# Altium schematic symbol library jlcpcb_2025_04_capacitors_extended_0402.schlib: 3594 symbols (part 5 of 20) (continued)
## C0402X7R104K250NTB
designator C?  Capacitance: 100nF  (hidden comment: *)
Capacitor, Ceramic (MLCC), 100nF, ±10%, 25V, X7R, ±10%, SMD 0402; Manufacturer: EYANG(Shenzhen Eyang Tech Development); Manufacturer Part Number: C0402X7R104K250NTB; Package Size: 0402; JLCPCB Basic Part: No; JLCPCB Part Number: C778290; Supplier 1: LCSC; Category: Capacitors - MLCC; Supplier Part Number 1: C778290; Tolerance: ±10%; Voltage Rating: 25V; Temperature Coefficient: X7R; RoHS: Yes; ComponentLink1Description: Datasheet; ComponentLink1URL: https://datasheet.lcsc.com/lcsc/2009101507_EYANG-Shenzhen-Eyang-Tech-Development-C0402X7R104K250NTB_C778290.pdf; ComponentLink2Description: JLCPCB Part URL; ComponentLink2URL: https://jlcpcb.com/partdetail/C778290; ComponentLink3Description: LCSC Part URL; ComponentLink3URL: https://lcsc.com/product-detail/Multilayer-Ceramic-Capacitors-MLCC---SMD-SMT_EYANGShenzhen-Eyang-Tech-Development-EYANGShenzhen-Eyang-Tech-Development-C0402X7R104K250NTB_C778290.html
footprint CAP-0402 (0402 (1005M) Capacitor)
pins: 1, 2

## C0402X7R104K250NTN
designator C?  Capacitance: 100nF  (hidden comment: *)
Capacitor, Ceramic (MLCC), 100nF, ±10%, 25V, X7R, ±10%, SMD 0402; Manufacturer: EYANG(Shenzhen Eyang Tech Development); Manufacturer Part Number: C0402X7R104K250NTN; Package Size: 0402; JLCPCB Basic Part: No; JLCPCB Part Number: C314229; Supplier 1: LCSC; Category: Capacitors - MLCC; Supplier Part Number 1: C314229; Tolerance: ±10%; Voltage Rating: 25V; Temperature Coefficient: X7R; RoHS: Yes; ComponentLink1Description: Datasheet; ComponentLink1URL: https://datasheet.lcsc.com/lcsc/2304140030_EYANG-Shenzhen-Eyang-Tech-Development-C0402X7R104K250NTN_C314229.pdf; ComponentLink2Description: JLCPCB Part URL; ComponentLink2URL: https://jlcpcb.com/partdetail/C314229; ComponentLink3Description: LCSC Part URL; ComponentLink3URL: https://lcsc.com/product-detail/Multilayer-Ceramic-Capacitors-MLCC---SMD-SMT_EYANGShenzhen-Eyang-Tech-Development-EYANGShenzhen-Eyang-Tech-Development-C0402X7R104K250NTN_C314229.html
footprint CAP-0402 (0402 (1005M) Capacitor)
pins: 1, 2

## C0402X7R122K160NTB
designator C?  Capacitance: 1.2nF  (hidden comment: *)
Capacitor, Ceramic (MLCC), 1.2nF, ±10%, 16V, X7R, ±10%, SMD 0402; Manufacturer: EYANG(Shenzhen Eyang Tech Development); Manufacturer Part Number: C0402X7R122K160NTB; Package Size: 0402; JLCPCB Basic Part: No; JLCPCB Part Number: C778309; Supplier 1: LCSC; Category: Capacitors - MLCC; Supplier Part Number 1: C778309; Tolerance: ±10%; Voltage Rating: 16V; Temperature Coefficient: X7R; RoHS: Yes; ComponentLink1Description: Datasheet; ComponentLink1URL: https://datasheet.lcsc.com/lcsc/2009051609_EYANG-Shenzhen-Eyang-Tech-Development-C0402X7R122K160NTB_C778309.pdf; ComponentLink2Description: JLCPCB Part URL; ComponentLink2URL: https://jlcpcb.com/partdetail/C778309; ComponentLink3Description: LCSC Part URL; ComponentLink3URL: https://lcsc.com/product-detail/Multilayer-Ceramic-Capacitors-MLCC---SMD-SMT_EYANGShenzhen-Eyang-Tech-Development-EYANGShenzhen-Eyang-Tech-Development-C0402X7R122K160NTB_C778309.html
footprint CAP-0402 (0402 (1005M) Capacitor)
pins: 1, 2

## C0402X7R122K500NTB
designator C?  Capacitance: 1.2nF  (hidden comment: *)
Capacitor, Ceramic (MLCC), 1.2nF, ±10%, 50V, X7R, ±10%, SMD 0402; Manufacturer: EYANG(Shenzhen Eyang Tech Development); Manufacturer Part Number: C0402X7R122K500NTB; Package Size: 0402; JLCPCB Basic Part: No; JLCPCB Part Number: C778390; Supplier 1: LCSC; Category: Capacitors - MLCC; Supplier Part Number 1: C778390; Tolerance: ±10%; Voltage Rating: 50V; Temperature Coefficient: X7R; RoHS: Yes; ComponentLink1Description: Datasheet; ComponentLink1URL: https://datasheet.lcsc.com/lcsc/2009051610_EYANG-Shenzhen-Eyang-Tech-Development-C0402X7R122K500NTB_C778390.pdf; ComponentLink2Description: JLCPCB Part URL; ComponentLink2URL: https://jlcpcb.com/partdetail/C778390; ComponentLink3Description: LCSC Part URL; ComponentLink3URL: https://lcsc.com/product-detail/Multilayer-Ceramic-Capacitors-MLCC---SMD-SMT_EYANGShenzhen-Eyang-Tech-Development-EYANGShenzhen-Eyang-Tech-Development-C0402X7R122K500NTB_C778390.html
footprint CAP-0402 (0402 (1005M) Capacitor)
pins: 1, 2

## C0402X7R151K500NTB
designator C?  Capacitance: 150pF  (hidden comment: *)
Capacitor, Ceramic (MLCC), 150pF, ±10%, 50V, X7R, ±10%, SMD 0402; Manufacturer: EYANG(Shenzhen Eyang Tech Development); Manufacturer Part Number: C0402X7R151K500NTB; Package Size: 0402; JLCPCB Basic Part: No; JLCPCB Part Number: C115673; Supplier 1: LCSC; Category: Capacitors - MLCC; Supplier Part Number 1: C115673; Tolerance: ±10%; Voltage Rating: 50V; Temperature Coefficient: X7R; RoHS: Yes; ComponentLink1Description: Datasheet; ComponentLink1URL: https://datasheet.lcsc.com/lcsc/2304140030_EYANG-Shenzhen-Eyang-Tech-Development-C0402X7R151K500NTB_C115673.pdf; ComponentLink2Description: JLCPCB Part URL; ComponentLink2URL: https://jlcpcb.com/partdetail/C115673; ComponentLink3Description: LCSC Part URL; ComponentLink3URL: https://lcsc.com/product-detail/Multilayer-Ceramic-Capacitors-MLCC---SMD-SMT_EYANGShenzhen-Eyang-Tech-Development-EYANGShenzhen-Eyang-Tech-Development-C0402X7R151K500NTB_C115673.html
footprint CAP-0402 (0402 (1005M) Capacitor)
pins: 1, 2

## C0402X7R153M160NTB
designator C?  Capacitance: 15nF  (hidden comment: *)
Capacitor, Ceramic (MLCC), 15nF, ±20%, 16V, X7R, ±20%, SMD 0402; Manufacturer: EYANG(Shenzhen Eyang Tech Development); Manufacturer Part Number: C0402X7R153M160NTB; Package Size: 0402; JLCPCB Basic Part: No; JLCPCB Part Number: C234199; Supplier 1: LCSC; Category: Capacitors - MLCC; Supplier Part Number 1: C234199; Tolerance: ±20%; Voltage Rating: 16V; Temperature Coefficient: X7R; RoHS: Yes; ComponentLink1Description: Datasheet; ComponentLink1URL: https://datasheet.lcsc.com/lcsc/1811021623_EYANG-Shenzhen-Eyang-Tech-Development-C0402X7R153M160NTB_C234199.pdf; ComponentLink2Description: JLCPCB Part URL; ComponentLink2URL: https://jlcpcb.com/partdetail/C234199; ComponentLink3Description: LCSC Part URL; ComponentLink3URL: https://lcsc.com/product-detail/Multilayer-Ceramic-Capacitors-MLCC---SMD-SMT_EYANGShenzhen-Eyang-Tech-Development-EYANGShenzhen-Eyang-Tech-Development-C0402X7R153M160NTB_C234199.html
footprint CAP-0402 (0402 (1005M) Capacitor)
pins: 1, 2

## C0402X7R182K500NTB
designator C?  Capacitance: 1.8nF  (hidden comment: *)
Capacitor, Ceramic (MLCC), 1.8nF, ±10%, 50V, X7R, ±10%, SMD 0402; Manufacturer: EYANG(Shenzhen Eyang Tech Development); Manufacturer Part Number: C0402X7R182K500NTB; Package Size: 0402; JLCPCB Basic Part: No; JLCPCB Part Number: C115676; Supplier 1: LCSC; Category: Capacitors - MLCC; Supplier Part Number 1: C115676; Tolerance: ±10%; Voltage Rating: 50V; Temperature Coefficient: X7R; RoHS: Yes; ComponentLink1Description: Datasheet; ComponentLink1URL: https://datasheet.lcsc.com/lcsc/2304140030_EYANG-Shenzhen-Eyang-Tech-Development-C0402X7R182K500NTB_C115676.pdf; ComponentLink2Description: JLCPCB Part URL; ComponentLink2URL: https://jlcpcb.com/partdetail/C115676; ComponentLink3Description: LCSC Part URL; ComponentLink3URL: https://lcsc.com/product-detail/Multilayer-Ceramic-Capacitors-MLCC---SMD-SMT_EYANGShenzhen-Eyang-Tech-Development-EYANGShenzhen-Eyang-Tech-Development-C0402X7R182K500NTB_C115676.html
footprint CAP-0402 (0402 (1005M) Capacitor)
pins: 1, 2

## C0402X7R182M500NTB
designator C?  Capacitance: 1.8nF  (hidden comment: *)
Capacitor, Ceramic (MLCC), 1.8nF, ±20%, 50V, X7R, ±20%, SMD 0402; Manufacturer: EYANG(Shenzhen Eyang Tech Development); Manufacturer Part Number: C0402X7R182M500NTB; Package Size: 0402; JLCPCB Basic Part: No; JLCPCB Part Number: C183744; Supplier 1: LCSC; Category: Capacitors - MLCC; Supplier Part Number 1: C183744; Tolerance: ±20%; Voltage Rating: 50V; Temperature Coefficient: X7R; RoHS: Yes; ComponentLink1Description: Datasheet; ComponentLink1URL: https://datasheet.lcsc.com/lcsc/2304140030_EYANG-Shenzhen-Eyang-Tech-Development-C0402X7R182M500NTB_C183744.pdf; ComponentLink2Description: JLCPCB Part URL; ComponentLink2URL: https://jlcpcb.com/partdetail/C183744; ComponentLink3Description: LCSC Part URL; ComponentLink3URL: https://lcsc.com/product-detail/Multilayer-Ceramic-Capacitors-MLCC---SMD-SMT_EYANGShenzhen-Eyang-Tech-Development-EYANGShenzhen-Eyang-Tech-Development-C0402X7R182M500NTB_C183744.html
footprint CAP-0402 (0402 (1005M) Capacitor)
pins: 1, 2

## C0402X7R221K500NTB
designator C?  Capacitance: 220pF  (hidden comment: *)
Capacitor, Ceramic (MLCC), 220pF, ±10%, 50V, X7R, ±10%, SMD 0402; Manufacturer: EYANG(Shenzhen Eyang Tech Development); Manufacturer Part Number: C0402X7R221K500NTB; Package Size: 0402; JLCPCB Basic Part: No; JLCPCB Part Number: C115677; Supplier 1: LCSC; Category: Capacitors - MLCC; Supplier Part Number 1: C115677; Tolerance: ±10%; Voltage Rating: 50V; Temperature Coefficient: X7R; RoHS: Yes; ComponentLink1Description: Datasheet; ComponentLink1URL: https://datasheet.lcsc.com/lcsc/2304140030_EYANG-Shenzhen-Eyang-Tech-Development-C0402X7R221K500NTB_C115677.pdf; ComponentLink2Description: JLCPCB Part URL; ComponentLink2URL: https://jlcpcb.com/partdetail/C115677; ComponentLink3Description: LCSC Part URL; ComponentLink3URL: https://lcsc.com/product-detail/Multilayer-Ceramic-Capacitors-MLCC---SMD-SMT_EYANGShenzhen-Eyang-Tech-Development-EYANGShenzhen-Eyang-Tech-Development-C0402X7R221K500NTB_C115677.html
footprint CAP-0402 (0402 (1005M) Capacitor)
pins: 1, 2

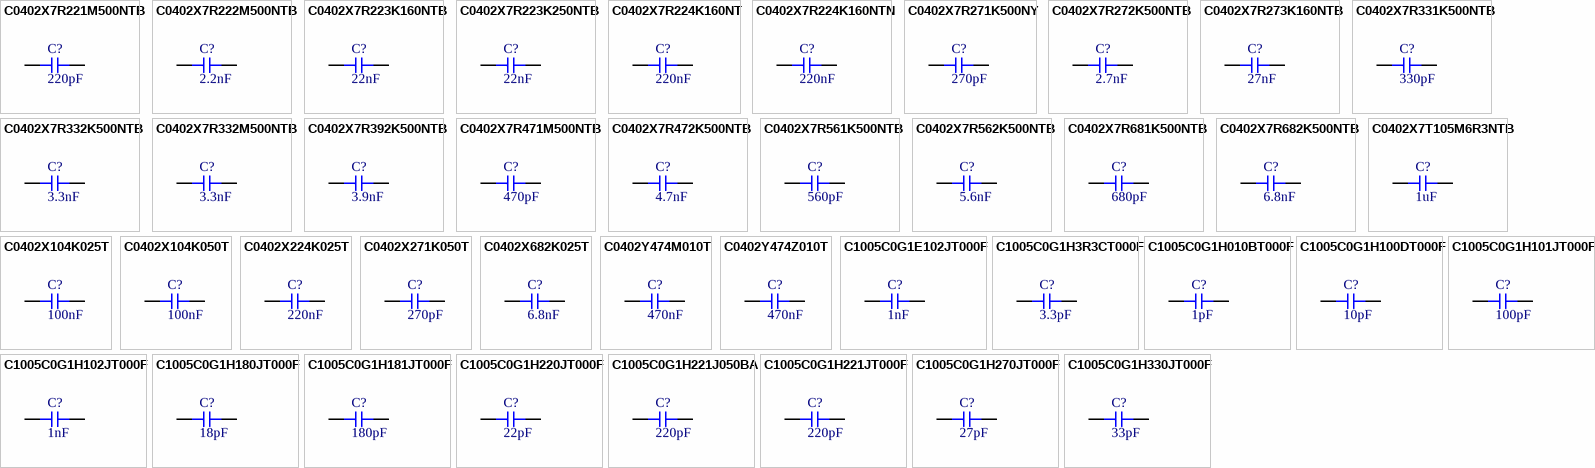
[diagram p22: symbols C0402X7R221M500NTB to C1005C0G1H330JT000F]

## C0402X7R221M500NTB
designator C?  Capacitance: 220pF  (hidden comment: *)
Capacitor, Ceramic (MLCC), 220pF, ±20%, 50V, X7R, ±20%, SMD 0402; Manufacturer: EYANG(Shenzhen Eyang Tech Development); Manufacturer Part Number: C0402X7R221M500NTB; Package Size: 0402; JLCPCB Basic Part: No; JLCPCB Part Number: C183730; Supplier 1: LCSC; Category: Capacitors - MLCC; Supplier Part Number 1: C183730; Tolerance: ±20%; Voltage Rating: 50V; Temperature Coefficient: X7R; RoHS: Yes; ComponentLink1Description: Datasheet; ComponentLink1URL: https://datasheet.lcsc.com/lcsc/2304140030_EYANG-Shenzhen-Eyang-Tech-Development-C0402X7R221M500NTB_C183730.pdf; ComponentLink2Description: JLCPCB Part URL; ComponentLink2URL: https://jlcpcb.com/partdetail/C183730; ComponentLink3Description: LCSC Part URL; ComponentLink3URL: https://lcsc.com/product-detail/Multilayer-Ceramic-Capacitors-MLCC---SMD-SMT_EYANGShenzhen-Eyang-Tech-Development-EYANGShenzhen-Eyang-Tech-Development-C0402X7R221M500NTB_C183730.html
footprint CAP-0402 (0402 (1005M) Capacitor)
pins: 1, 2

## C0402X7R222M500NTB
designator C?  Capacitance: 2.2nF  (hidden comment: *)
Capacitor, Ceramic (MLCC), 2.2nF, ±20%, 50V, X7R, ±20%, SMD 0402; Manufacturer: EYANG(Shenzhen Eyang Tech Development); Manufacturer Part Number: C0402X7R222M500NTB; Package Size: 0402; JLCPCB Basic Part: No; JLCPCB Part Number: C183745; Supplier 1: LCSC; Category: Capacitors - MLCC; Supplier Part Number 1: C183745; Tolerance: ±20%; Voltage Rating: 50V; Temperature Coefficient: X7R; RoHS: Yes; ComponentLink1Description: Datasheet; ComponentLink1URL: https://datasheet.lcsc.com/lcsc/2304140030_EYANG-Shenzhen-Eyang-Tech-Development-C0402X7R222M500NTB_C183745.pdf; ComponentLink2Description: JLCPCB Part URL; ComponentLink2URL: https://jlcpcb.com/partdetail/C183745; ComponentLink3Description: LCSC Part URL; ComponentLink3URL: https://lcsc.com/product-detail/Multilayer-Ceramic-Capacitors-MLCC---SMD-SMT_EYANGShenzhen-Eyang-Tech-Development-EYANGShenzhen-Eyang-Tech-Development-C0402X7R222M500NTB_C183745.html
footprint CAP-0402 (0402 (1005M) Capacitor)
pins: 1, 2

## C0402X7R223K160NTB
designator C?  Capacitance: 22nF  (hidden comment: *)
Capacitor, Ceramic (MLCC), 22nF, ±10%, 16V, X7R, ±10%, SMD 0402; Manufacturer: EYANG(Shenzhen Eyang Tech Development); Manufacturer Part Number: C0402X7R223K160NTB; Package Size: 0402; JLCPCB Basic Part: No; JLCPCB Part Number: C234031; Supplier 1: LCSC; Category: Capacitors - MLCC; Supplier Part Number 1: C234031; Tolerance: ±10%; Voltage Rating: 16V; Temperature Coefficient: X7R; RoHS: Yes; ComponentLink1Description: Datasheet; ComponentLink1URL: https://datasheet.lcsc.com/lcsc/1811021623_EYANG-Shenzhen-Eyang-Tech-Development-C0402X7R223K160NTB_C234031.pdf; ComponentLink2Description: JLCPCB Part URL; ComponentLink2URL: https://jlcpcb.com/partdetail/C234031; ComponentLink3Description: LCSC Part URL; ComponentLink3URL: https://lcsc.com/product-detail/Multilayer-Ceramic-Capacitors-MLCC---SMD-SMT_EYANGShenzhen-Eyang-Tech-Development-EYANGShenzhen-Eyang-Tech-Development-C0402X7R223K160NTB_C234031.html
footprint CAP-0402 (0402 (1005M) Capacitor)
pins: 1, 2

## C0402X7R223K250NTB
designator C?  Capacitance: 22nF  (hidden comment: *)
Capacitor, Ceramic (MLCC), 22nF, ±10%, 25V, X7R, ±10%, SMD 0402; Manufacturer: EYANG(Shenzhen Eyang Tech Development); Manufacturer Part Number: C0402X7R223K250NTB; Package Size: 0402; JLCPCB Basic Part: No; JLCPCB Part Number: C183767; Supplier 1: LCSC; Category: Capacitors - MLCC; Supplier Part Number 1: C183767; Tolerance: ±10%; Voltage Rating: 25V; Temperature Coefficient: X7R; RoHS: Yes; ComponentLink1Description: Datasheet; ComponentLink1URL: https://datasheet.lcsc.com/lcsc/2304140030_EYANG-Shenzhen-Eyang-Tech-Development-C0402X7R223K250NTB_C183767.pdf; ComponentLink2Description: JLCPCB Part URL; ComponentLink2URL: https://jlcpcb.com/partdetail/C183767; ComponentLink3Description: LCSC Part URL; ComponentLink3URL: https://lcsc.com/product-detail/Multilayer-Ceramic-Capacitors-MLCC---SMD-SMT_EYANGShenzhen-Eyang-Tech-Development-EYANGShenzhen-Eyang-Tech-Development-C0402X7R223K250NTB_C183767.html
footprint CAP-0402 (0402 (1005M) Capacitor)
pins: 1, 2

## C0402X7R224K160NT
designator C?  Capacitance: 220nF  (hidden comment: *)
Capacitor, Ceramic (MLCC), 220nF, ±10%, 16V, X7R, ±10%, SMD 0402; Manufacturer: SANYEAR; Manufacturer Part Number: C0402X7R224K160NT; Package Size: 0402; JLCPCB Basic Part: No; JLCPCB Part Number: C475248; Supplier 1: LCSC; Category: Capacitors - MLCC; Supplier Part Number 1: C475248; Tolerance: ±10%; Voltage Rating: 16V; Temperature Coefficient: X7R; RoHS: Yes; ComponentLink1Description: Datasheet; ComponentLink1URL: https://wmsc.lcsc.com/wmsc/upload/file/pdf/v2/lcsc/2304140030_SANYEAR-C0402X7R224K160NT_C475248.pdf; ComponentLink2Description: JLCPCB Part URL; ComponentLink2URL: https://jlcpcb.com/partdetail/C475248; ComponentLink3Description: LCSC Part URL; ComponentLink3URL: https://lcsc.com/product-detail/Multilayer-Ceramic-Capacitors-MLCC---SMD-SMT_SANYEAR-SANYEAR-C0402X7R224K160NT_C475248.html
footprint CAP-0402 (0402 (1005M) Capacitor)
pins: 1, 2

## C0402X7R224K160NTN
designator C?  Capacitance: 220nF  (hidden comment: *)
Capacitor, Ceramic (MLCC), 220nF, ±10%, 16V, X7R, ±10%, SMD 0402; Manufacturer: EYANG(Shenzhen Eyang Tech Development); Manufacturer Part Number: C0402X7R224K160NTN; Package Size: 0402; JLCPCB Basic Part: No; JLCPCB Part Number: C314232; Supplier 1: LCSC; Category: Capacitors - MLCC; Supplier Part Number 1: C314232; Tolerance: ±10%; Voltage Rating: 16V; Temperature Coefficient: X7R; RoHS: Yes; ComponentLink1Description: Datasheet; ComponentLink1URL: https://datasheet.lcsc.com/lcsc/2304140030_EYANG-Shenzhen-Eyang-Tech-Development-C0402X7R224K160NTN_C314232.pdf; ComponentLink2Description: JLCPCB Part URL; ComponentLink2URL: https://jlcpcb.com/partdetail/C314232; ComponentLink3Description: LCSC Part URL; ComponentLink3URL: https://lcsc.com/product-detail/Multilayer-Ceramic-Capacitors-MLCC---SMD-SMT_EYANGShenzhen-Eyang-Tech-Development-EYANGShenzhen-Eyang-Tech-Development-C0402X7R224K160NTN_C314232.html
footprint CAP-0402 (0402 (1005M) Capacitor)
pins: 1, 2

## C0402X7R271K500NY
designator C?  Capacitance: 270pF  (hidden comment: *)
Capacitor, Ceramic (MLCC), 270pF, ±10%, 50V, X7R, ±10%, SMD 0402; Manufacturer: EYANG(Shenzhen Eyang Tech Development); Manufacturer Part Number: C0402X7R271K500NY; Package Size: 0402; JLCPCB Basic Part: No; JLCPCB Part Number: C314226; Supplier 1: LCSC; Category: Capacitors - MLCC; Supplier Part Number 1: C314226; Tolerance: ±10%; Voltage Rating: 50V; Temperature Coefficient: X7R; RoHS: Yes; ComponentLink1Description: Datasheet; ComponentLink1URL: https://datasheet.lcsc.com/lcsc/2304140030_EYANG-Shenzhen-Eyang-Tech-Development-C0402X7R271K500NY_C314226.pdf; ComponentLink2Description: JLCPCB Part URL; ComponentLink2URL: https://jlcpcb.com/partdetail/C314226; ComponentLink3Description: LCSC Part URL; ComponentLink3URL: https://lcsc.com/product-detail/Multilayer-Ceramic-Capacitors-MLCC---SMD-SMT_EYANGShenzhen-Eyang-Tech-Development-EYANGShenzhen-Eyang-Tech-Development-C0402X7R271K500NY_C314226.html
footprint CAP-0402 (0402 (1005M) Capacitor)
pins: 1, 2

## C0402X7R272K500NTB
designator C?  Capacitance: 2.7nF  (hidden comment: *)
Capacitor, Ceramic (MLCC), 2.7nF, ±10%, 50V, X7R, ±10%, SMD 0402; Manufacturer: EYANG(Shenzhen Eyang Tech Development); Manufacturer Part Number: C0402X7R272K500NTB; Package Size: 0402; JLCPCB Basic Part: No; JLCPCB Part Number: C115680; Supplier 1: LCSC; Category: Capacitors - MLCC; Supplier Part Number 1: C115680; Tolerance: ±10%; Voltage Rating: 50V; Temperature Coefficient: X7R; RoHS: Yes; ComponentLink1Description: Datasheet; ComponentLink1URL: https://datasheet.lcsc.com/lcsc/2304140030_EYANG-Shenzhen-Eyang-Tech-Development-C0402X7R272K500NTB_C115680.pdf; ComponentLink2Description: JLCPCB Part URL; ComponentLink2URL: https://jlcpcb.com/partdetail/C115680; ComponentLink3Description: LCSC Part URL; ComponentLink3URL: https://lcsc.com/product-detail/Multilayer-Ceramic-Capacitors-MLCC---SMD-SMT_EYANGShenzhen-Eyang-Tech-Development-EYANGShenzhen-Eyang-Tech-Development-C0402X7R272K500NTB_C115680.html
footprint CAP-0402 (0402 (1005M) Capacitor)
pins: 1, 2

## C0402X7R273K160NTB
designator C?  Capacitance: 27nF  (hidden comment: *)
Capacitor, Ceramic (MLCC), 27nF, ±10%, 16V, X7R, ±10%, SMD 0402; Manufacturer: EYANG(Shenzhen Eyang Tech Development); Manufacturer Part Number: C0402X7R273K160NTB; Package Size: 0402; JLCPCB Basic Part: No; JLCPCB Part Number: C778389; Supplier 1: LCSC; Category: Capacitors - MLCC; Supplier Part Number 1: C778389; Tolerance: ±10%; Voltage Rating: 16V; Temperature Coefficient: X7R; RoHS: Yes; ComponentLink1Description: Datasheet; ComponentLink1URL: https://datasheet.lcsc.com/lcsc/2009051610_EYANG-Shenzhen-Eyang-Tech-Development-C0402X7R273K160NTB_C778389.pdf; ComponentLink2Description: JLCPCB Part URL; ComponentLink2URL: https://jlcpcb.com/partdetail/C778389; ComponentLink3Description: LCSC Part URL; ComponentLink3URL: https://lcsc.com/product-detail/Multilayer-Ceramic-Capacitors-MLCC---SMD-SMT_EYANGShenzhen-Eyang-Tech-Development-EYANGShenzhen-Eyang-Tech-Development-C0402X7R273K160NTB_C778389.html
footprint CAP-0402 (0402 (1005M) Capacitor)
pins: 1, 2

## C0402X7R331K500NTB
designator C?  Capacitance: 330pF  (hidden comment: *)
Capacitor, Ceramic (MLCC), 330pF, ±10%, 50V, X7R, ±10%, SMD 0402; Manufacturer: EYANG(Shenzhen Eyang Tech Development); Manufacturer Part Number: C0402X7R331K500NTB; Package Size: 0402; JLCPCB Basic Part: No; JLCPCB Part Number: C115681; Supplier 1: LCSC; Category: Capacitors - MLCC; Supplier Part Number 1: C115681; Tolerance: ±10%; Voltage Rating: 50V; Temperature Coefficient: X7R; RoHS: Yes; ComponentLink1Description: Datasheet; ComponentLink1URL: https://datasheet.lcsc.com/lcsc/2304140030_EYANG-Shenzhen-Eyang-Tech-Development-C0402X7R331K500NTB_C115681.pdf; ComponentLink2Description: JLCPCB Part URL; ComponentLink2URL: https://jlcpcb.com/partdetail/C115681; ComponentLink3Description: LCSC Part URL; ComponentLink3URL: https://lcsc.com/product-detail/Multilayer-Ceramic-Capacitors-MLCC---SMD-SMT_EYANGShenzhen-Eyang-Tech-Development-EYANGShenzhen-Eyang-Tech-Development-C0402X7R331K500NTB_C115681.html
footprint CAP-0402 (0402 (1005M) Capacitor)
pins: 1, 2

## C0402X7R332K500NTB
designator C?  Capacitance: 3.3nF  (hidden comment: *)
Capacitor, Ceramic (MLCC), 3.3nF, ±10%, 50V, X7R, ±10%, SMD 0402; Manufacturer: EYANG(Shenzhen Eyang Tech Development); Manufacturer Part Number: C0402X7R332K500NTB; Package Size: 0402; JLCPCB Basic Part: No; JLCPCB Part Number: C115682; Supplier 1: LCSC; Category: Capacitors - MLCC; Supplier Part Number 1: C115682; Tolerance: ±10%; Voltage Rating: 50V; Temperature Coefficient: X7R; RoHS: Yes; ComponentLink1Description: Datasheet; ComponentLink1URL: https://datasheet.lcsc.com/lcsc/2304140030_EYANG-Shenzhen-Eyang-Tech-Development-C0402X7R332K500NTB_C115682.pdf; ComponentLink2Description: JLCPCB Part URL; ComponentLink2URL: https://jlcpcb.com/partdetail/C115682; ComponentLink3Description: LCSC Part URL; ComponentLink3URL: https://lcsc.com/product-detail/Multilayer-Ceramic-Capacitors-MLCC---SMD-SMT_EYANGShenzhen-Eyang-Tech-Development-EYANGShenzhen-Eyang-Tech-Development-C0402X7R332K500NTB_C115682.html
footprint CAP-0402 (0402 (1005M) Capacitor)
pins: 1, 2

## C0402X7R332M500NTB
designator C?  Capacitance: 3.3nF  (hidden comment: *)
Capacitor, Ceramic (MLCC), 3.3nF, ±20%, 50V, X7R, ±20%, SMD 0402; Manufacturer: EYANG(Shenzhen Eyang Tech Development); Manufacturer Part Number: C0402X7R332M500NTB; Package Size: 0402; JLCPCB Basic Part: No; JLCPCB Part Number: C183746; Supplier 1: LCSC; Category: Capacitors - MLCC; Supplier Part Number 1: C183746; Tolerance: ±20%; Voltage Rating: 50V; Temperature Coefficient: X7R; RoHS: Yes; ComponentLink1Description: Datasheet; ComponentLink1URL: https://datasheet.lcsc.com/lcsc/2304140030_EYANG-Shenzhen-Eyang-Tech-Development-C0402X7R332M500NTB_C183746.pdf; ComponentLink2Description: JLCPCB Part URL; ComponentLink2URL: https://jlcpcb.com/partdetail/C183746; ComponentLink3Description: LCSC Part URL; ComponentLink3URL: https://lcsc.com/product-detail/Multilayer-Ceramic-Capacitors-MLCC---SMD-SMT_EYANGShenzhen-Eyang-Tech-Development-EYANGShenzhen-Eyang-Tech-Development-C0402X7R332M500NTB_C183746.html
footprint CAP-0402 (0402 (1005M) Capacitor)
pins: 1, 2

## C0402X7R392K500NTB
designator C?  Capacitance: 3.9nF  (hidden comment: *)
Capacitor, Ceramic (MLCC), 3.9nF, ±10%, 50V, X7R, ±10%, SMD 0402; Manufacturer: EYANG(Shenzhen Eyang Tech Development); Manufacturer Part Number: C0402X7R392K500NTB; Package Size: 0402; JLCPCB Basic Part: No; JLCPCB Part Number: C115684; Supplier 1: LCSC; Category: Capacitors - MLCC; Supplier Part Number 1: C115684; Tolerance: ±10%; Voltage Rating: 50V; Temperature Coefficient: X7R; RoHS: Yes; ComponentLink1Description: Datasheet; ComponentLink1URL: https://datasheet.lcsc.com/lcsc/2304140030_EYANG-Shenzhen-Eyang-Tech-Development-C0402X7R392K500NTB_C115684.pdf; ComponentLink2Description: JLCPCB Part URL; ComponentLink2URL: https://jlcpcb.com/partdetail/C115684; ComponentLink3Description: LCSC Part URL; ComponentLink3URL: https://lcsc.com/product-detail/Multilayer-Ceramic-Capacitors-MLCC---SMD-SMT_EYANGShenzhen-Eyang-Tech-Development-EYANGShenzhen-Eyang-Tech-Development-C0402X7R392K500NTB_C115684.html
footprint CAP-0402 (0402 (1005M) Capacitor)
pins: 1, 2

## C0402X7R471M500NTB
designator C?  Capacitance: 470pF  (hidden comment: *)
Capacitor, Ceramic (MLCC), 470pF, ±20%, 50V, X7R, ±20%, SMD 0402; Manufacturer: EYANG(Shenzhen Eyang Tech Development); Manufacturer Part Number: C0402X7R471M500NTB; Package Size: 0402; JLCPCB Basic Part: No; JLCPCB Part Number: C183734; Supplier 1: LCSC; Category: Capacitors - MLCC; Supplier Part Number 1: C183734; Tolerance: ±20%; Voltage Rating: 50V; Temperature Coefficient: X7R; RoHS: Yes; ComponentLink1Description: Datasheet; ComponentLink1URL: https://datasheet.lcsc.com/lcsc/2304140030_EYANG-Shenzhen-Eyang-Tech-Development-C0402X7R471M500NTB_C183734.pdf; ComponentLink2Description: JLCPCB Part URL; ComponentLink2URL: https://jlcpcb.com/partdetail/C183734; ComponentLink3Description: LCSC Part URL; ComponentLink3URL: https://lcsc.com/product-detail/Multilayer-Ceramic-Capacitors-MLCC---SMD-SMT_EYANGShenzhen-Eyang-Tech-Development-EYANGShenzhen-Eyang-Tech-Development-C0402X7R471M500NTB_C183734.html
footprint CAP-0402 (0402 (1005M) Capacitor)
pins: 1, 2

## C0402X7R472K500NTB
designator C?  Capacitance: 4.7nF  (hidden comment: *)
Capacitor, Ceramic (MLCC), 4.7nF, ±10%, 50V, X7R, ±10%, SMD 0402; Manufacturer: EYANG(Shenzhen Eyang Tech Development); Manufacturer Part Number: C0402X7R472K500NTB; Package Size: 0402; JLCPCB Basic Part: No; JLCPCB Part Number: C115686; Supplier 1: LCSC; Category: Capacitors - MLCC; Supplier Part Number 1: C115686; Tolerance: ±10%; Voltage Rating: 50V; Temperature Coefficient: X7R; RoHS: Yes; ComponentLink1Description: Datasheet; ComponentLink1URL: https://datasheet.lcsc.com/lcsc/2304140030_EYANG-Shenzhen-Eyang-Tech-Development-C0402X7R472K500NTB_C115686.pdf; ComponentLink2Description: JLCPCB Part URL; ComponentLink2URL: https://jlcpcb.com/partdetail/C115686; ComponentLink3Description: LCSC Part URL; ComponentLink3URL: https://lcsc.com/product-detail/Multilayer-Ceramic-Capacitors-MLCC---SMD-SMT_EYANGShenzhen-Eyang-Tech-Development-EYANGShenzhen-Eyang-Tech-Development-C0402X7R472K500NTB_C115686.html
footprint CAP-0402 (0402 (1005M) Capacitor)
pins: 1, 2

## C0402X7R561K500NTB
designator C?  Capacitance: 560pF  (hidden comment: *)
Capacitor, Ceramic (MLCC), 560pF, ±10%, 50V, X7R, ±10%, SMD 0402; Manufacturer: EYANG(Shenzhen Eyang Tech Development); Manufacturer Part Number: C0402X7R561K500NTB; Package Size: 0402; JLCPCB Basic Part: No; JLCPCB Part Number: C115687; Supplier 1: LCSC; Category: Capacitors - MLCC; Supplier Part Number 1: C115687; Tolerance: ±10%; Voltage Rating: 50V; Temperature Coefficient: X7R; RoHS: Yes; ComponentLink1Description: Datasheet; ComponentLink1URL: https://datasheet.lcsc.com/lcsc/2304140030_EYANG-Shenzhen-Eyang-Tech-Development-C0402X7R561K500NTB_C115687.pdf; ComponentLink2Description: JLCPCB Part URL; ComponentLink2URL: https://jlcpcb.com/partdetail/C115687; ComponentLink3Description: LCSC Part URL; ComponentLink3URL: https://lcsc.com/product-detail/Multilayer-Ceramic-Capacitors-MLCC---SMD-SMT_EYANGShenzhen-Eyang-Tech-Development-EYANGShenzhen-Eyang-Tech-Development-C0402X7R561K500NTB_C115687.html
footprint CAP-0402 (0402 (1005M) Capacitor)
pins: 1, 2

## C0402X7R562K500NTB
designator C?  Capacitance: 5.6nF  (hidden comment: *)
Capacitor, Ceramic (MLCC), 5.6nF, ±10%, 50V, X7R, ±10%, SMD 0402; Manufacturer: EYANG(Shenzhen Eyang Tech Development); Manufacturer Part Number: C0402X7R562K500NTB; Package Size: 0402; JLCPCB Basic Part: No; JLCPCB Part Number: C115688; Supplier 1: LCSC; Category: Capacitors - MLCC; Supplier Part Number 1: C115688; Tolerance: ±10%; Voltage Rating: 50V; Temperature Coefficient: X7R; RoHS: Yes; ComponentLink1Description: Datasheet; ComponentLink1URL: https://datasheet.lcsc.com/lcsc/2304140030_EYANG-Shenzhen-Eyang-Tech-Development-C0402X7R562K500NTB_C115688.pdf; ComponentLink2Description: JLCPCB Part URL; ComponentLink2URL: https://jlcpcb.com/partdetail/C115688; ComponentLink3Description: LCSC Part URL; ComponentLink3URL: https://lcsc.com/product-detail/Multilayer-Ceramic-Capacitors-MLCC---SMD-SMT_EYANGShenzhen-Eyang-Tech-Development-EYANGShenzhen-Eyang-Tech-Development-C0402X7R562K500NTB_C115688.html
footprint CAP-0402 (0402 (1005M) Capacitor)
pins: 1, 2

## C0402X7R681K500NTB
designator C?  Capacitance: 680pF  (hidden comment: *)
Capacitor, Ceramic (MLCC), 680pF, ±10%, 50V, X7R, ±10%, SMD 0402; Manufacturer: EYANG(Shenzhen Eyang Tech Development); Manufacturer Part Number: C0402X7R681K500NTB; Package Size: 0402; JLCPCB Basic Part: No; JLCPCB Part Number: C115689; Supplier 1: LCSC; Category: Capacitors - MLCC; Supplier Part Number 1: C115689; Tolerance: ±10%; Voltage Rating: 50V; Temperature Coefficient: X7R; RoHS: Yes; ComponentLink1Description: Datasheet; ComponentLink1URL: https://datasheet.lcsc.com/lcsc/2304140030_EYANG-Shenzhen-Eyang-Tech-Development-C0402X7R681K500NTB_C115689.pdf; ComponentLink2Description: JLCPCB Part URL; ComponentLink2URL: https://jlcpcb.com/partdetail/C115689; ComponentLink3Description: LCSC Part URL; ComponentLink3URL: https://lcsc.com/product-detail/Multilayer-Ceramic-Capacitors-MLCC---SMD-SMT_EYANGShenzhen-Eyang-Tech-Development-EYANGShenzhen-Eyang-Tech-Development-C0402X7R681K500NTB_C115689.html
footprint CAP-0402 (0402 (1005M) Capacitor)
pins: 1, 2

## C0402X7R682K500NTB
designator C?  Capacitance: 6.8nF  (hidden comment: *)
Capacitor, Ceramic (MLCC), 6.8nF, ±10%, 50V, X7R, ±10%, SMD 0402; Manufacturer: EYANG(Shenzhen Eyang Tech Development); Manufacturer Part Number: C0402X7R682K500NTB; Package Size: 0402; JLCPCB Basic Part: No; JLCPCB Part Number: C115690; Supplier 1: LCSC; Category: Capacitors - MLCC; Supplier Part Number 1: C115690; Tolerance: ±10%; Voltage Rating: 50V; Temperature Coefficient: X7R; RoHS: Yes; ComponentLink1Description: Datasheet; ComponentLink1URL: https://datasheet.lcsc.com/lcsc/2304140030_EYANG-Shenzhen-Eyang-Tech-Development-C0402X7R682K500NTB_C115690.pdf; ComponentLink2Description: JLCPCB Part URL; ComponentLink2URL: https://jlcpcb.com/partdetail/C115690; ComponentLink3Description: LCSC Part URL; ComponentLink3URL: https://lcsc.com/product-detail/Multilayer-Ceramic-Capacitors-MLCC---SMD-SMT_EYANGShenzhen-Eyang-Tech-Development-EYANGShenzhen-Eyang-Tech-Development-C0402X7R682K500NTB_C115690.html
footprint CAP-0402 (0402 (1005M) Capacitor)
pins: 1, 2

## C0402X7T105M6R3NTB
designator C?  Capacitance: 1uF  (hidden comment: *)
Capacitor, Ceramic (MLCC), 1uF, ±20%, 6.3V, X7T, ±20%, SMD 0402; Manufacturer: EYANG(Shenzhen Eyang Tech Development); Manufacturer Part Number: C0402X7T105M6R3NTB; Package Size: 0402; JLCPCB Basic Part: No; JLCPCB Part Number: C314234; Supplier 1: LCSC; Category: Capacitors - MLCC; Supplier Part Number 1: C314234; Tolerance: ±20%; Voltage Rating: 6.3V; Temperature Coefficient: X7T; RoHS: Yes; ComponentLink1Description: Datasheet; ComponentLink1URL: https://datasheet.lcsc.com/lcsc/2304140030_EYANG-Shenzhen-Eyang-Tech-Development-C0402X7T105M6R3NTB_C314234.pdf; ComponentLink2Description: JLCPCB Part URL; ComponentLink2URL: https://jlcpcb.com/partdetail/C314234; ComponentLink3Description: LCSC Part URL; ComponentLink3URL: https://lcsc.com/product-detail/Multilayer-Ceramic-Capacitors-MLCC---SMD-SMT_EYANGShenzhen-Eyang-Tech-Development-EYANGShenzhen-Eyang-Tech-Development-C0402X7T105M6R3NTB_C314234.html
footprint CAP-0402 (0402 (1005M) Capacitor)
pins: 1, 2

## C0402X104K025T
designator C?  Capacitance: 100nF  (hidden comment: *)
Capacitor, Ceramic (MLCC), 100nF, ±10%, 25V, X7R, ±10%, SMD 0402; Manufacturer: IHHEC(HOLY STONE ENTERPRISE CO., LTD); Manufacturer Part Number: C0402X104K025T; Package Size: 0402; JLCPCB Basic Part: No; JLCPCB Part Number: C559125; Supplier 1: LCSC; Category: Capacitors - MLCC; Supplier Part Number 1: C559125; Tolerance: ±10%; Voltage Rating: 25V; Temperature Coefficient: X7R; RoHS: Yes; ComponentLink1Description: Datasheet; ComponentLink1URL: https://wmsc.lcsc.com/wmsc/upload/file/pdf/v2/lcsc/2304140030_IHHEC-HOLY-STONE-ENTERPRISE-CO---LTD-C0402X104K025T_C559125.pdf; ComponentLink2Description: JLCPCB Part URL; ComponentLink2URL: https://jlcpcb.com/partdetail/C559125; ComponentLink3Description: LCSC Part URL; ComponentLink3URL: https://lcsc.com/product-detail/Multilayer-Ceramic-Capacitors-MLCC---SMD-SMT_IHHECHOLY-STONE-ENTERPRISE-CO.%2C-LTD-IHHECHOLY-STONE-ENTERPRISE-CO.%2C-LTD-C0402X104K025T_C559125.html
footprint CAP-0402 (0402 (1005M) Capacitor)
pins: 1, 2

## C0402X104K050T
designator C?  Capacitance: 100nF  (hidden comment: *)
Capacitor, Ceramic (MLCC), 100nF, ±10%, 50V, X7R, ±10%, SMD 0402; Manufacturer: IHHEC(HOLY STONE ENTERPRISE CO., LTD); Manufacturer Part Number: C0402X104K050T; Package Size: 0402; JLCPCB Basic Part: No; JLCPCB Part Number: C501838; Supplier 1: LCSC; Category: Capacitors - MLCC; Supplier Part Number 1: C501838; Tolerance: ±10%; Voltage Rating: 50V; Temperature Coefficient: X7R; RoHS: Yes; ComponentLink1Description: Datasheet; ComponentLink1URL: https://wmsc.lcsc.com/wmsc/upload/file/pdf/v2/lcsc/2304140030_IHHEC-HOLY-STONE-ENTERPRISE-CO---LTD-C0402X104K050T_C501838.pdf; ComponentLink2Description: JLCPCB Part URL; ComponentLink2URL: https://jlcpcb.com/partdetail/C501838; ComponentLink3Description: LCSC Part URL; ComponentLink3URL: https://lcsc.com/product-detail/Multilayer-Ceramic-Capacitors-MLCC---SMD-SMT_IHHECHOLY-STONE-ENTERPRISE-CO.%2C-LTD-IHHECHOLY-STONE-ENTERPRISE-CO.%2C-LTD-C0402X104K050T_C501838.html
footprint CAP-0402 (0402 (1005M) Capacitor)
pins: 1, 2

## C0402X224K025T
designator C?  Capacitance: 220nF  (hidden comment: *)
Capacitor, Ceramic (MLCC), 220nF, ±10%, 25V, X7R, ±10%, SMD 0402; Manufacturer: IHHEC(HOLY STONE ENTERPRISE CO., LTD); Manufacturer Part Number: C0402X224K025T; Package Size: 0402; JLCPCB Basic Part: No; JLCPCB Part Number: C4355189; Supplier 1: LCSC; Category: Capacitors - MLCC; Supplier Part Number 1: C4355189; Tolerance: ±10%; Voltage Rating: 25V; Temperature Coefficient: X7R; RoHS: Yes; ComponentLink1Description: Datasheet; ComponentLink1URL: https://wmsc.lcsc.com/wmsc/upload/file/pdf/v2/lcsc/2207151800_IHHEC-HOLY-STONE-ENTERPRISE-CO---LTD-C0402X224K025T_C4355189.pdf; ComponentLink2Description: JLCPCB Part URL; ComponentLink2URL: https://jlcpcb.com/partdetail/C4355189; ComponentLink3Description: LCSC Part URL; ComponentLink3URL: https://lcsc.com/product-detail/Multilayer-Ceramic-Capacitors-MLCC---SMD-SMT_IHHECHOLY-STONE-ENTERPRISE-CO.%2C-LTD-IHHECHOLY-STONE-ENTERPRISE-CO.%2C-LTD-C0402X224K025T_C4355189.html
footprint CAP-0402 (0402 (1005M) Capacitor)
pins: 1, 2

## C0402X271K050T
designator C?  Capacitance: 270pF  (hidden comment: *)
Capacitor, Ceramic (MLCC), 270pF, ±10%, 50V, X7R, ±10%, SMD 0402; Manufacturer: IHHEC(HOLY STONE ENTERPRISE CO., LTD); Manufacturer Part Number: C0402X271K050T; Package Size: 0402; JLCPCB Basic Part: No; JLCPCB Part Number: C961497; Supplier 1: LCSC; Category: Capacitors - MLCC; Supplier Part Number 1: C961497; Tolerance: ±10%; Voltage Rating: 50V; Temperature Coefficient: X7R; RoHS: Yes; ComponentLink1Description: Datasheet; ComponentLink1URL: https://wmsc.lcsc.com/wmsc/upload/file/pdf/v2/lcsc/2304140030_IHHEC-HOLY-STONE-ENTERPRISE-CO---LTD-C0402X271K050T_C961497.pdf; ComponentLink2Description: JLCPCB Part URL; ComponentLink2URL: https://jlcpcb.com/partdetail/C961497; ComponentLink3Description: LCSC Part URL; ComponentLink3URL: https://lcsc.com/product-detail/Multilayer-Ceramic-Capacitors-MLCC---SMD-SMT_IHHECHOLY-STONE-ENTERPRISE-CO.%2C-LTD-IHHECHOLY-STONE-ENTERPRISE-CO.%2C-LTD-C0402X271K050T_C961497.html
footprint CAP-0402 (0402 (1005M) Capacitor)
pins: 1, 2

## C0402X682K025T
designator C?  Capacitance: 6.8nF  (hidden comment: *)
Capacitor, Ceramic (MLCC), 6.8nF, ±10%, 25V, X7R, ±10%, SMD 0402; Manufacturer: IHHEC(HOLY STONE ENTERPRISE CO., LTD); Manufacturer Part Number: C0402X682K025T; Package Size: 0402; JLCPCB Basic Part: No; JLCPCB Part Number: C961500; Supplier 1: LCSC; Category: Capacitors - MLCC; Supplier Part Number 1: C961500; Tolerance: ±10%; Voltage Rating: 25V; Temperature Coefficient: X7R; RoHS: Yes; ComponentLink1Description: Datasheet; ComponentLink1URL: https://wmsc.lcsc.com/wmsc/upload/file/pdf/v2/lcsc/2304140030_IHHEC-HOLY-STONE-ENTERPRISE-CO---LTD-C0402X682K025T_C961500.pdf; ComponentLink2Description: JLCPCB Part URL; ComponentLink2URL: https://jlcpcb.com/partdetail/C961500; ComponentLink3Description: LCSC Part URL; ComponentLink3URL: https://lcsc.com/product-detail/Multilayer-Ceramic-Capacitors-MLCC---SMD-SMT_IHHECHOLY-STONE-ENTERPRISE-CO.%2C-LTD-IHHECHOLY-STONE-ENTERPRISE-CO.%2C-LTD-C0402X682K025T_C961500.html
footprint CAP-0402 (0402 (1005M) Capacitor)
pins: 1, 2

## C0402Y474M010T
designator C?  Capacitance: 470nF  (hidden comment: *)
Capacitor, Ceramic (MLCC), 470nF, ±20%, 10V, Y5V, ±20%, SMD 0402; Manufacturer: IHHEC(HOLY STONE ENTERPRISE CO., LTD); Manufacturer Part Number: C0402Y474M010T; Package Size: 0402; JLCPCB Basic Part: No; JLCPCB Part Number: C961501; Supplier 1: LCSC; Category: Capacitors - MLCC; Supplier Part Number 1: C961501; Tolerance: ±20%; Voltage Rating: 10V; Temperature Coefficient: Y5V; RoHS: Yes; ComponentLink1Description: Datasheet; ComponentLink1URL: https://wmsc.lcsc.com/wmsc/upload/file/pdf/v2/lcsc/2207081430_IHHEC-HOLY-STONE-ENTERPRISE-CO---LTD-C0402Y474M010T_C961501.pdf; ComponentLink2Description: JLCPCB Part URL; ComponentLink2URL: https://jlcpcb.com/partdetail/C961501; ComponentLink3Description: LCSC Part URL; ComponentLink3URL: https://lcsc.com/product-detail/Multilayer-Ceramic-Capacitors-MLCC---SMD-SMT_IHHECHOLY-STONE-ENTERPRISE-CO.%2C-LTD-IHHECHOLY-STONE-ENTERPRISE-CO.%2C-LTD-C0402Y474M010T_C961501.html
footprint CAP-0402 (0402 (1005M) Capacitor)
pins: 1, 2

## C0402Y474Z010T
designator C?  Capacitance: 470nF  (hidden comment: *)
Capacitor, Ceramic (MLCC), 470nF, 10V, SMD 0402; Manufacturer: IHHEC(HOLY STONE ENTERPRISE CO., LTD); Manufacturer Part Number: C0402Y474Z010T; Temperature Rating: -20%~+80%; Package Size: 0402; JLCPCB Basic Part: No; JLCPCB Part Number: C188347; Supplier 1: LCSC; Category: Capacitors - MLCC; Supplier Part Number 1: C188347; Voltage Rating: 10V; RoHS: Yes; ComponentLink1Description: Datasheet; ComponentLink2Description: JLCPCB Part URL; ComponentLink2URL: https://jlcpcb.com/partdetail/C188347; ComponentLink3Description: LCSC Part URL; ComponentLink3URL: https://lcsc.com/product-detail/Multilayer-Ceramic-Capacitors-MLCC---SMD-SMT_IHHECHOLY-STONE-ENTERPRISE-CO.%2C-LTD-IHHECHOLY-STONE-ENTERPRISE-CO.%2C-LTD-C0402Y474Z010T_C188347.html
footprint CAP-0402 (0402 (1005M) Capacitor)
pins: 1, 2

## C1005C0G1E102JT000F
designator C?  Capacitance: 1nF  (hidden comment: *)
Capacitor, Ceramic (MLCC), 1nF, ±5%, 25V, C0G, ±5%, SMD 0402; Manufacturer: TDK; Manufacturer Part Number: C1005C0G1E102JT000F; Package Size: 0402; JLCPCB Basic Part: No; JLCPCB Part Number: C343059; Supplier 1: LCSC; Category: Capacitors - MLCC; Supplier Part Number 1: C343059; Tolerance: ±5%; Voltage Rating: 25V; Temperature Coefficient: C0G; RoHS: Yes; ComponentLink1Description: Datasheet; ComponentLink1URL: https://wmsc.lcsc.com/wmsc/upload/file/pdf/v2/lcsc/2304140030_TDK-C1005C0G1E102JT000F_C343059.pdf; ComponentLink2Description: JLCPCB Part URL; ComponentLink2URL: https://jlcpcb.com/partdetail/C343059; ComponentLink3Description: LCSC Part URL; ComponentLink3URL: https://lcsc.com/product-detail/Multilayer-Ceramic-Capacitors-MLCC---SMD-SMT_TDK-TDK-C1005C0G1E102JT000F_C343059.html
footprint CAP-0402 (0402 (1005M) Capacitor)
pins: 1, 2

## C1005C0G1H3R3CT000F
designator C?  Capacitance: 3.3pF  (hidden comment: *)
Capacitor, Ceramic (MLCC), 3.3pF, 50V, C0G, SMD 0402; Manufacturer: TDK; Manufacturer Part Number: C1005C0G1H3R3CT000F; Package Size: 0402; JLCPCB Basic Part: No; JLCPCB Part Number: C694152; Supplier 1: LCSC; Category: Capacitors - MLCC; Supplier Part Number 1: C694152; Voltage Rating: 50V; Temperature Coefficient: C0G; RoHS: Yes; ComponentLink1Description: Datasheet; ComponentLink1URL: https://wmsc.lcsc.com/wmsc/upload/file/pdf/v2/lcsc/2304140030_TDK-C1005C0G1H3R3CT000F_C694152.pdf; ComponentLink2Description: JLCPCB Part URL; ComponentLink2URL: https://jlcpcb.com/partdetail/C694152; ComponentLink3Description: LCSC Part URL; ComponentLink3URL: https://lcsc.com/product-detail/Multilayer-Ceramic-Capacitors-MLCC---SMD-SMT_TDK-TDK-C1005C0G1H3R3CT000F_C694152.html
footprint CAP-0402 (0402 (1005M) Capacitor)
pins: 1, 2

## C1005C0G1H010BT000F
designator C?  Capacitance: 1pF  (hidden comment: *)
Capacitor, Ceramic (MLCC), 1pF, 50V, C0G, SMD 0402; Manufacturer: TDK; Manufacturer Part Number: C1005C0G1H010BT000F; Package Size: 0402; JLCPCB Basic Part: No; JLCPCB Part Number: C338010; Supplier 1: LCSC; Category: Capacitors - MLCC; Supplier Part Number 1: C338010; Voltage Rating: 50V; Temperature Coefficient: C0G; RoHS: Yes; ComponentLink1Description: Datasheet; ComponentLink1URL: https://wmsc.lcsc.com/wmsc/upload/file/pdf/v2/lcsc/2304140030_TDK-C1005C0G1H010BT000F_C338010.pdf; ComponentLink2Description: JLCPCB Part URL; ComponentLink2URL: https://jlcpcb.com/partdetail/C338010; ComponentLink3Description: LCSC Part URL; ComponentLink3URL: https://lcsc.com/product-detail/Multilayer-Ceramic-Capacitors-MLCC---SMD-SMT_TDK-TDK-C1005C0G1H010BT000F_C338010.html
footprint CAP-0402 (0402 (1005M) Capacitor)
pins: 1, 2

## C1005C0G1H100DT000F
designator C?  Capacitance: 10pF  (hidden comment: *)
Capacitor, Ceramic (MLCC), 10pF, 50V, C0G, SMD 0402; Manufacturer: TDK; Manufacturer Part Number: C1005C0G1H100DT000F; Package Size: 0402; JLCPCB Basic Part: No; JLCPCB Part Number: C445764; Supplier 1: LCSC; Category: Capacitors - MLCC; Supplier Part Number 1: C445764; Voltage Rating: 50V; Temperature Coefficient: C0G; RoHS: Yes; ComponentLink1Description: Datasheet; ComponentLink1URL: https://wmsc.lcsc.com/wmsc/upload/file/pdf/v2/lcsc/2304140030_TDK-C1005C0G1H100DT000F_C445764.pdf; ComponentLink2Description: JLCPCB Part URL; ComponentLink2URL: https://jlcpcb.com/partdetail/C445764; ComponentLink3Description: LCSC Part URL; ComponentLink3URL: https://lcsc.com/product-detail/Multilayer-Ceramic-Capacitors-MLCC---SMD-SMT_TDK-TDK-C1005C0G1H100DT000F_C445764.html
footprint CAP-0402 (0402 (1005M) Capacitor)
pins: 1, 2

## C1005C0G1H101JT000F
designator C?  Capacitance: 100pF  (hidden comment: *)
Capacitor, Ceramic (MLCC), 100pF, ±5%, 50V, C0G, ±5%, SMD 0402; Manufacturer: TDK; Manufacturer Part Number: C1005C0G1H101JT000F; Package Size: 0402; JLCPCB Basic Part: No; JLCPCB Part Number: C445763; Supplier 1: LCSC; Category: Capacitors - MLCC; Supplier Part Number 1: C445763; Tolerance: ±5%; Voltage Rating: 50V; Temperature Coefficient: C0G; RoHS: Yes; ComponentLink1Description: Datasheet; ComponentLink1URL: https://wmsc.lcsc.com/wmsc/upload/file/pdf/v2/lcsc/2304140030_TDK-C1005C0G1H101JT000F_C445763.pdf; ComponentLink2Description: JLCPCB Part URL; ComponentLink2URL: https://jlcpcb.com/partdetail/C445763; ComponentLink3Description: LCSC Part URL; ComponentLink3URL: https://lcsc.com/product-detail/Multilayer-Ceramic-Capacitors-MLCC---SMD-SMT_TDK-TDK-C1005C0G1H101JT000F_C445763.html
footprint CAP-0402 (0402 (1005M) Capacitor)
pins: 1, 2

## C1005C0G1H102JT000F
designator C?  Capacitance: 1nF  (hidden comment: *)
Capacitor, Ceramic (MLCC), 1nF, ±5%, 50V, C0G, ±5%, SMD 0402; Manufacturer: TDK; Manufacturer Part Number: C1005C0G1H102JT000F; Package Size: 0402; JLCPCB Basic Part: No; JLCPCB Part Number: C343060; Supplier 1: LCSC; Category: Capacitors - MLCC; Supplier Part Number 1: C343060; Tolerance: ±5%; Voltage Rating: 50V; Temperature Coefficient: C0G; RoHS: Yes; ComponentLink1Description: Datasheet; ComponentLink1URL: https://wmsc.lcsc.com/wmsc/upload/file/pdf/v2/lcsc/2304140030_TDK-C1005C0G1H102JT000F_C343060.pdf; ComponentLink2Description: JLCPCB Part URL; ComponentLink2URL: https://jlcpcb.com/partdetail/C343060; ComponentLink3Description: LCSC Part URL; ComponentLink3URL: https://lcsc.com/product-detail/Multilayer-Ceramic-Capacitors-MLCC---SMD-SMT_TDK-TDK-C1005C0G1H102JT000F_C343060.html
footprint CAP-0402 (0402 (1005M) Capacitor)
pins: 1, 2

## C1005C0G1H180JT000F
designator C?  Capacitance: 18pF  (hidden comment: *)
Capacitor, Ceramic (MLCC), 18pF, ±5%, 50V, C0G, ±5%, SMD 0402; Manufacturer: TDK; Manufacturer Part Number: C1005C0G1H180JT000F; Package Size: 0402; JLCPCB Basic Part: No; JLCPCB Part Number: C445762; Supplier 1: LCSC; Category: Capacitors - MLCC; Supplier Part Number 1: C445762; Tolerance: ±5%; Voltage Rating: 50V; Temperature Coefficient: C0G; RoHS: Yes; ComponentLink1Description: Datasheet; ComponentLink1URL: https://wmsc.lcsc.com/wmsc/upload/file/pdf/v2/lcsc/2304140030_TDK-C1005C0G1H180JT000F_C445762.pdf; ComponentLink2Description: JLCPCB Part URL; ComponentLink2URL: https://jlcpcb.com/partdetail/C445762; ComponentLink3Description: LCSC Part URL; ComponentLink3URL: https://lcsc.com/product-detail/Multilayer-Ceramic-Capacitors-MLCC---SMD-SMT_TDK-TDK-C1005C0G1H180JT000F_C445762.html
footprint CAP-0402 (0402 (1005M) Capacitor)
pins: 1, 2

## C1005C0G1H181JT000F
designator C?  Capacitance: 180pF  (hidden comment: *)
Capacitor, Ceramic (MLCC), 180pF, ±5%, 50V, C0G, ±5%, SMD 0402; Manufacturer: TDK; Manufacturer Part Number: C1005C0G1H181JT000F; Package Size: 0402; JLCPCB Basic Part: No; JLCPCB Part Number: C56472; Supplier 1: LCSC; Category: Capacitors - MLCC; Supplier Part Number 1: C56472; Tolerance: ±5%; Voltage Rating: 50V; Temperature Coefficient: C0G; RoHS: Yes; ComponentLink1Description: Datasheet; ComponentLink1URL: https://wmsc.lcsc.com/wmsc/upload/file/pdf/v2/lcsc/1809212031_TDK-C1005C0G1H181JT000F_C56472.pdf; ComponentLink2Description: JLCPCB Part URL; ComponentLink2URL: https://jlcpcb.com/partdetail/C56472; ComponentLink3Description: LCSC Part URL; ComponentLink3URL: https://lcsc.com/product-detail/Multilayer-Ceramic-Capacitors-MLCC---SMD-SMT_TDK-TDK-C1005C0G1H181JT000F_C56472.html
footprint CAP-0402 (0402 (1005M) Capacitor)
pins: 1, 2

## C1005C0G1H220JT000F
designator C?  Capacitance: 22pF  (hidden comment: *)
Capacitor, Ceramic (MLCC), 22pF, ±5%, 50V, C0G, ±5%, SMD 0402; Manufacturer: TDK; Manufacturer Part Number: C1005C0G1H220JT000F; Package Size: 0402; JLCPCB Basic Part: No; JLCPCB Part Number: C694268; Supplier 1: LCSC; Category: Capacitors - MLCC; Supplier Part Number 1: C694268; Tolerance: ±5%; Voltage Rating: 50V; Temperature Coefficient: C0G; RoHS: Yes; ComponentLink1Description: Datasheet; ComponentLink1URL: https://wmsc.lcsc.com/wmsc/upload/file/pdf/v2/lcsc/2304140030_TDK-C1005C0G1H220JT000F_C694268.pdf; ComponentLink2Description: JLCPCB Part URL; ComponentLink2URL: https://jlcpcb.com/partdetail/C694268; ComponentLink3Description: LCSC Part URL; ComponentLink3URL: https://lcsc.com/product-detail/Multilayer-Ceramic-Capacitors-MLCC---SMD-SMT_TDK-TDK-C1005C0G1H220JT000F_C694268.html
footprint CAP-0402 (0402 (1005M) Capacitor)
pins: 1, 2